# Altium schematic symbol library SparkFun.SCHLIB: 796 symbols (part 4 of 5) (continued)
## RESISTOR
designator R?, comment ResistorBasic schematic elements and footprints for 0603, 1206, and PTH 1/10th watt (small) resistors.
footprint 0805
pins: 1, 2

## RESISTOR0402-RES
designator R?, comment ResistorBasic schematic elements and footprints for 0603, 1206, and PTH 1/10th watt (small) resistors.
footprint 0402-RES
pins: 1, 2

## RESISTOR0603-RES
designator R?, comment ResistorBasic schematic elements and footprints for 0603, 1206, and PTH 1/10th watt (small) resistors.
footprint 0603-RES
pins: 1, 2

## RESISTOR1206
designator R?, comment ResistorBasic schematic elements and footprints for 0603, 1206, and PTH 1/10th watt (small) resistors.
footprint 1206
pins: 1, 2

## RESISTOR2010
designator R?, comment ResistorBasic schematic elements and footprints for 0603, 1206, and PTH 1/10th watt (small) resistors.
footprint R2010
pins: 1, 2

## RESISTOR2512
designator R?, comment ResistorBasic schematic elements and footprints for 0603, 1206, and PTH 1/10th watt (small) resistors.
footprint R2512
pins: 1, 2

## RESISTORPTH1
designator R?, comment ResistorBasic schematic elements and footprints for 0603, 1206, and PTH 1/10th watt (small) resistors.
footprint AXIAL-0.3
pins: P$1 1, P$2 2

## RESISTORPTH-1/6W
designator R?, comment ResistorBasic schematic elements and footprints for 0603, 1206, and PTH 1/10th watt (small) resistors.
footprint 1/6W-RES
pins: 1, 2

## RESONATOR-WIDE
designator ?
footprint RESONATOR-WIDE-SMD
pins: 1, 2, 3

## RESONATOR_NOCAP
designator ?
footprint RESONATOR_NOCAP
pins: P$1 1, P$2 3

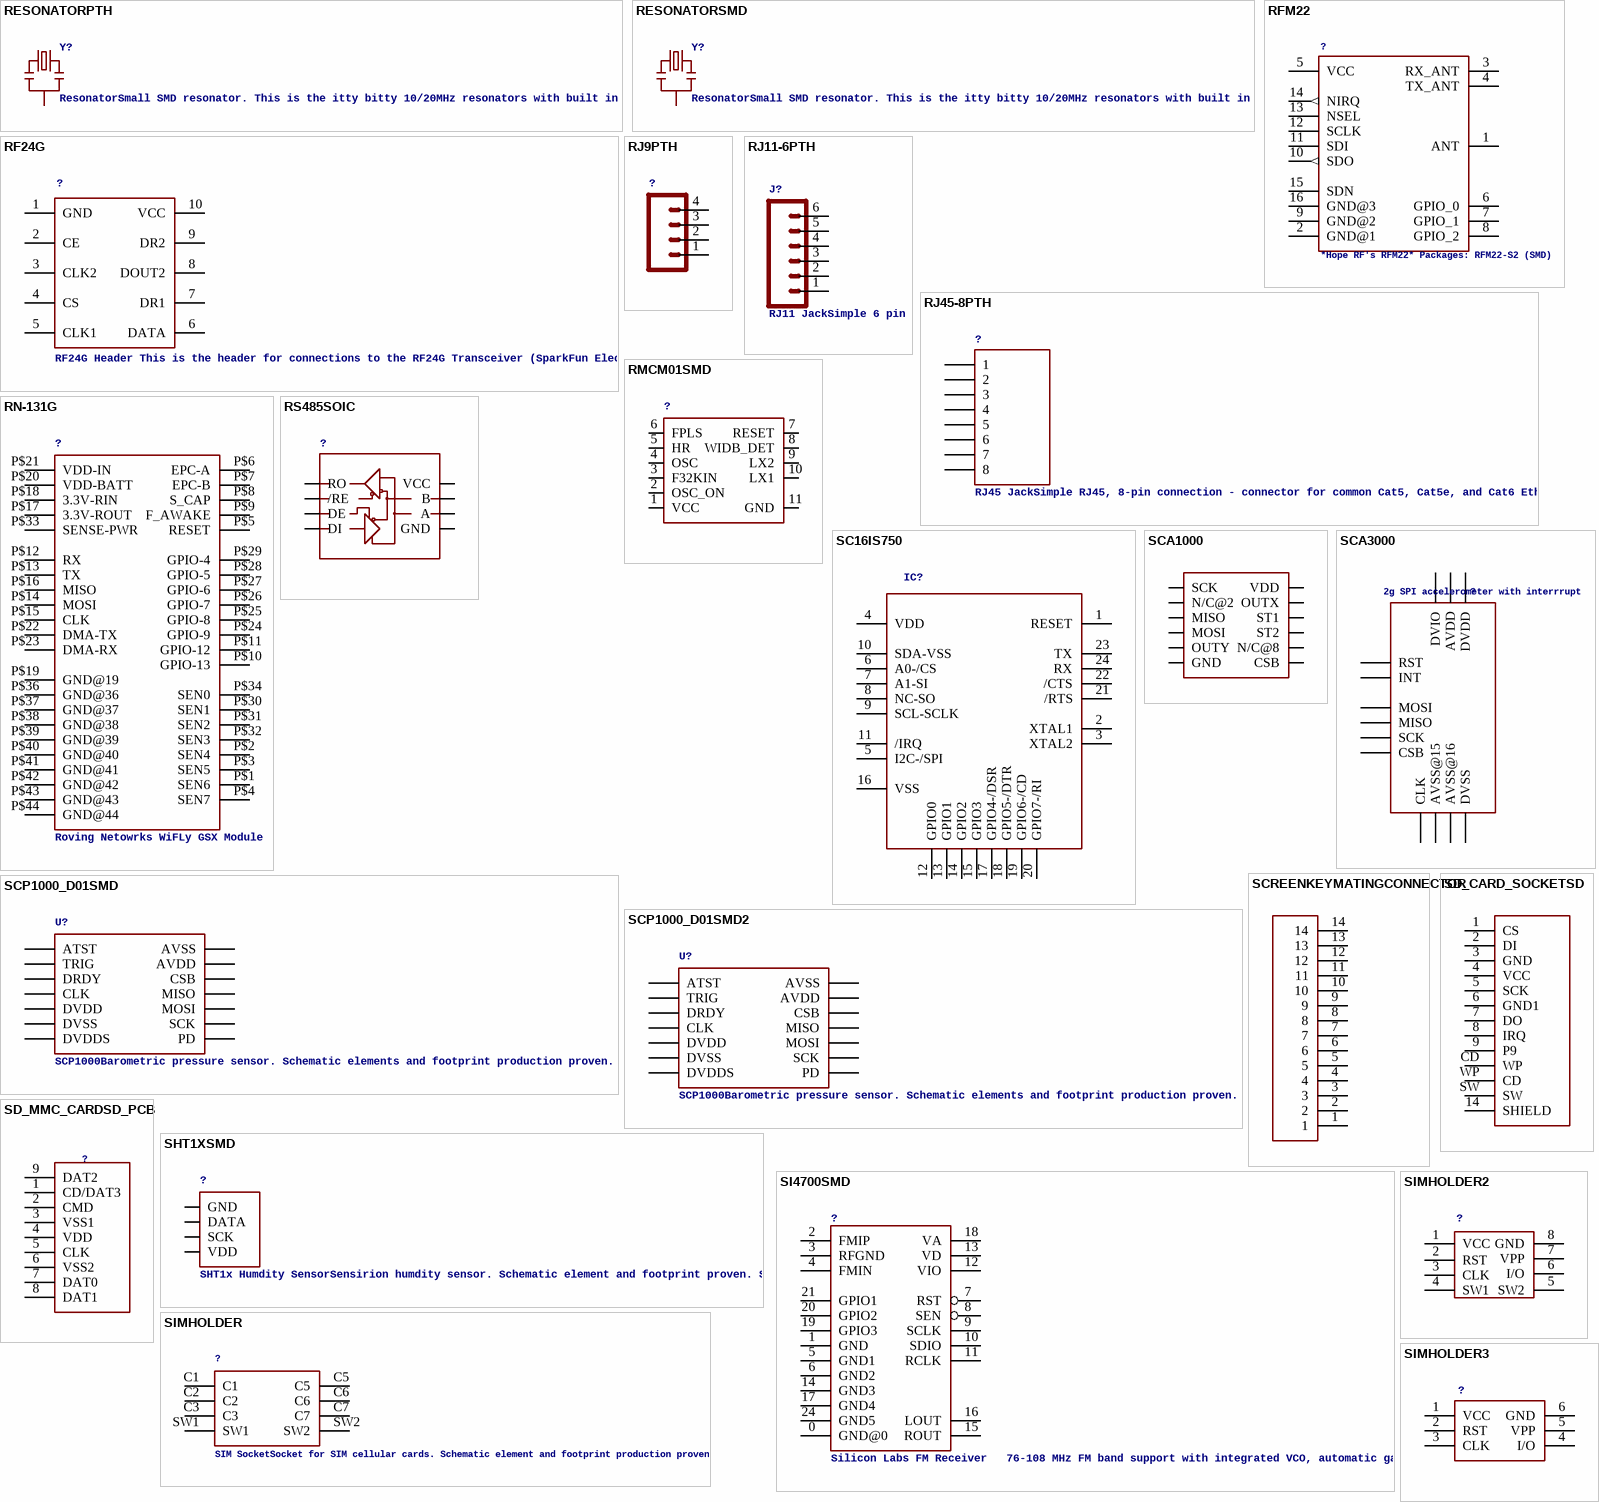
[diagram p29: symbols RESONATORPTH to SIMHOLDER3]

## RESONATORPTH
designator Y?, comment ResonatorSmall SMD resonator. This is the itty bitty 10/20MHz resonators with built in caps. CSTCE10M0G55 and CSTCE20M0V53. Footprint has been reviewed closely but hasn't been tested yet.
footprint RESONATOR-PTH
pins: 1, 2, 3

## RESONATORSMD
designator Y?, comment ResonatorSmall SMD resonator. This is the itty bitty 10/20MHz resonators with built in caps. CSTCE10M0G55 and CSTCE20M0V53. Footprint has been reviewed closely but hasn't been tested yet.
footprint RESONATOR-SMD
pins: 1, 2, 3

## RF24G
designator ?, comment RF24G Header This is the header for connections to the RF24G Transceiver (SparkFun Electronics SKU: WRL-00151), used in the Breakout Board for RF24G Transceiver (SparkFun Electronics SKU: BOB-00196). This footprint has not yet been proven in production.
footprint RF24G-2X5
pins: 1 GND, 2 CE, 3 CLK2, 4 CS, 5 CLK1, 6 DATA, 7 DR1, 8 DOUT2, 9 DR2, 10 VCC

## RFM22
designator ?, comment *Hope RF's RFM22* Packages: RFM22-S2 (SMD)
footprint RFM22-XXX-S2
pins: 1 ANT, 2 GND@1 (power), 3 RX_ANT, 4 TX_ANT, 5 VCC, 6 GPIO_0, 7 GPIO_1, 8 GPIO_2, 9 GND@2 (power), 10 SDO (out), 11 SDI, 12 SCLK, 13 NSEL, 14 NIRQ (out), 15 SDN, 16 GND@3 (power)

## RJ9PTH
designator ?
footprint RJ9
pins: 1, 2, 3, 4

## RJ11-6PTH
designator J?, comment RJ11 JackSimple 6 pin RJ11 jack. Commonly found on CAT3 devices and Microchip programmers. SKU: PRT-00132
footprint RJ11-6
pins: 1, 2, 3, 4, 5, 6

## RJ45-8PTH
designator ?, comment RJ45 JackSimple RJ45, 8-pin connection - connector for common Cat5, Cat5e, and Cat6 Ethernet cables. Footprint not yet proven in production. Connector sku is PRT-00643; Breakout PCB sku is BOB-00716.
footprint RJ45-8
pins: 1, 2, 3, 4, 5, 6, 7, 8

## RMCM01SMD
designator ?
footprint RMCM01
pins: 1 VCC, 2 OSC_ON, 3 F32KIN, 4 OSC, 5 HR, 6 FPLS, 7 RESET, 8 WIDB_DET, 9 LX2, 10 LX1, 11 GND

## RN-131G
designator ?, comment Roving Netowrks WiFLy GSX Module
footprint RN-131G
pins: P$1 SEN6, P$2 SEN4, P$3 SEN5, P$4 SEN7, P$5 RESET, P$6 EPC-A, P$7 EPC-B, P$8 S_CAP, P$9 F_AWAKE, P$10 GPIO-13, P$11 GPIO-12, P$12 RX, P$13 TX, P$14 MOSI, P$15 CLK, P$16 MISO, P$17 3.3V-ROUT, P$18 3.3V-RIN, P$19 GND@19, P$20 VDD-BATT, P$21 VDD-IN, P$22 DMA-TX, P$23 DMA-RX, P$24 GPIO-9, P$25 GPIO-8, P$26 GPIO-7, P$27 GPIO-6, P$28 GPIO-5, P$29 GPIO-4, P$30 SEN1, P$31 SEN2, P$32 SEN3, P$33 SENSE-PWR, P$34 SEN0, P$36 GND@36, P$37 GND@37, P$38 GND@38, P$39 GND@39, P$40 GND@40, P$41 GND@41, P$42 GND@42, P$43 GND@43, P$44 GND@44

## RS485SOIC
designator ?
footprint SO08
pins: 1 RO, 2 /RE, 3 DE, 4 DI, 5 GND, 6 A, 7 B, 8 VCC

## SC16IS750
designator IC?
footprint QFN-24
pins: 1 RESET, 2 XTAL1, 3 XTAL2, 4 VDD, 5 I2C-/SPI, 6 A0-/CS, 7 A1-SI, 8 NC-SO, 9 SCL-SCLK, 10 SDA-VSS, 11 /IRQ, 12 GPIO0, 13 GPIO1, 14 GPIO2, 15 GPIO3, 16 VSS, 17 GPIO4-/DSR, 18 GPIO5-/DTR, 19 GPIO6-/CD, 20 GPIO7-/RI, 21 /RTS, 22 /CTS, 23 TX, 24 RX

## SCA1000
designator ?
footprint SCA1000
pins: 1 SCK, 2 N/C@2, 3 MISO, 4 MOSI, 5 OUTY, 6 GND, 7 CSB, 8 N/C@8, 9 ST2, 10 ST1, 11 OUTX, 12 VDD

## SCA3000
designator ?, comment 2g SPI accelerometer with interrrupt
footprint SCA3000
pins: P$2 RST, P$3 INT, P$4 CLK, P$5 DVSS, P$6 DVDD, P$7 DVIO, P$8 CSB, P$11 SCK, P$12 MISO, P$13 MOSI, P$14 AVDD, P$15 AVSS@15, P$16 AVSS@16

## SCP1000_D01SMD
designator U?, comment SCP1000Barometric pressure sensor. Schematic elements and footprint production proven. Spark Fun Electronics SKU : COM-08128
footprint SCP1000
pins: ATST, AVDD, AVSS, CLK, CSB, DRDY, DVDD, DVDDS, DVSS, MISO, MOSI/SDA MOSI, PD, SCK/SCL SCK, TRIG

## SCP1000_D01SMD2
designator U?, comment SCP1000Barometric pressure sensor. Schematic elements and footprint production proven. Spark Fun Electronics SKU : COM-08128
footprint SCP1000-LG
pins: ATST, AVDD, AVSS, CLK, CSB, DRDY, DVDD, DVDDS, DVSS, MISO, MOSI/SDA MOSI, PD, SCK/SCL SCK, TRIG

## SCREENKEYMATINGCONNECTOR
designator ?
footprint SCREENKEYMATINGCONNECTOR
pins: 1, 2, 3, 4, 5, 6, 7, 8, 9, 10, 11, 12, 13, 14

## SD_CARD_SOCKETSD
designator ?, comment SD/MMC SocketMedia socket for SD and MMC cards. Push-push type. Schematic element and footprint production proven. Spark Fun Electronics SKU : PRT-00136  (value not drawn)
footprint SD-MMC_SOCKET-PP
pins: 1 CS, 2 DI, 3 GND, 4 VCC, 5 SCK, 6 GND1, 7 DO, 8 IRQ, 9 P9, 14 SHIELD, CD WP, SW, WP CD

## SD_MMC_CARDSD_PCB
designator ?
footprint SD-MMC-CARD
pins: 1 CD/DAT3, 2 CMD, 3 VSS1, 4 VDD, 5 CLK, 6 VSS2, 7 DAT0, 8 DAT1, 9 DAT2

## SHT1XSMD
designator ?, comment SHT1x Humdity SensorSensirion humdity sensor. Schematic element and footprint proven. Spark Fun Electronics SKU : COM-08227
footprint SHT1X
pins: 1 GND (power), 2 DATA, 3 SCK, 4 VDD (power)

## SI4700SMD
designator ?, comment Silicon Labs FM Receiver   76-108 MHz FM band support with integrated VCO, automatic gain control, automatic frequency control and seek tuning.
footprint SI4700/01-GM
pins: 0 GND@0, 1 GND, 2 FMIP, 3 RFGND, 4 FMIN, 5 GND1, 6 GND2, 7 RST, 8 SEN, 9 SCLK, 10 SDIO, 11 RCLK, 12 VIO (power), 13 VD (power), 14 GND3, 15 ROUT, 16 LOUT, 17 GND4, 18 VA (power), 19 GPIO3, 20 GPIO2, 21 GPIO1, 24 GND5

## SIMHOLDER
designator ?, comment SIM SocketSocket for SIM cellular cards. Schematic element and footprint production proven. Spark Fun Electronics SKU : PRT-00548
footprint SIMHOLDER
pins: C1, C2, C3, C5, C6, C7, SW1, SW2

## SIMHOLDER2
designator ?
footprint SIMHOLDER2
pins: 1 VCC, 2 RST, 3 CLK, 4 SW1, 5 SW2, 6 I/O, 7 VPP, 8 GND

## SIMHOLDER3
designator ?
footprint SIMHOLDER3
pins: 1 VCC, 2 RST, 3 CLK, 4 I/O, 5 VPP, 6 GND

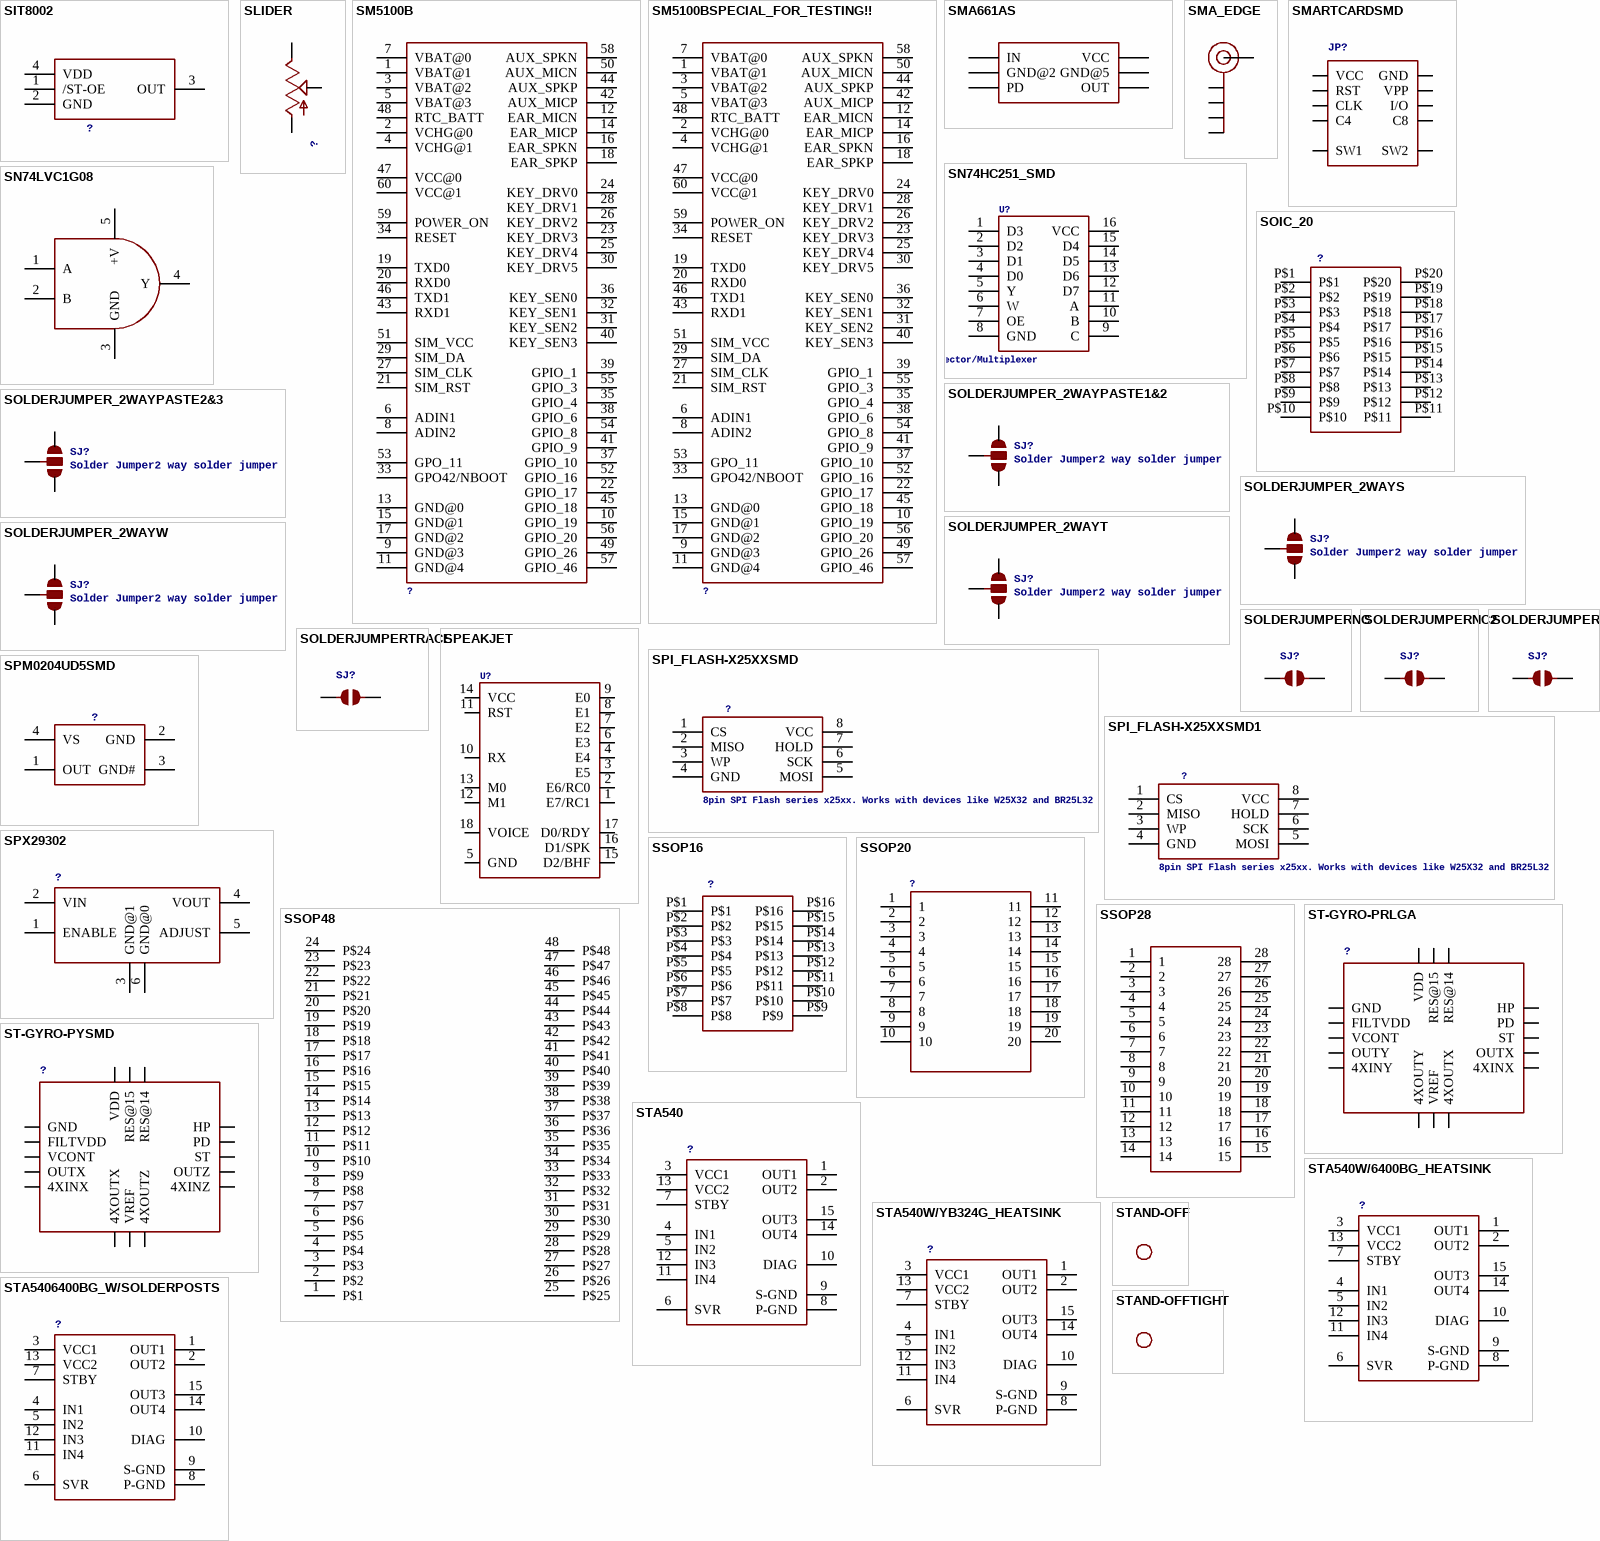
[diagram p30: symbols SIT8002 to STAND-OFFTIGHT]

## SIT8002
designator ?
footprint SIT8002
pins: 1 /ST-OE, 2 GND, 3 OUT, 4 VDD

## SLIDER
designator ?
footprint SLIDER
pins: 1 E, 2A S, 3 A

## SM5100B
designator ?
footprint SM5100B
pins: 1 VBAT@1, 2 VCHG@0, 3 VBAT@2, 4 VCHG@1, 5 VBAT@3, 6 ADIN1, 7 VBAT@0, 8 ADIN2, 9 GND@3, 10 GPIO_19, 11 GND@4, 12 EAR_MICN, 13 GND@0, 14 EAR_MICP, 15 GND@1, 16 EAR_SPKN, 17 GND@2, 18 EAR_SPKP, 19 TXD0, 20 RXD0, 21 SIM_RST, 22 GPIO_17, 23 KEY_DRV3, 24 KEY_DRV0, 25 KEY_DRV4, 26 KEY_DRV2, 27 SIM_CLK, 28 KEY_DRV1, 29 SIM_DA, 30 KEY_DRV5, 31 KEY_SEN2, 32 KEY_SEN1, 33 GPO42/NBOOT, 34 RESET, 35 GPIO_4, 36 KEY_SEN0, 37 GPIO_10, 38 GPIO_6, 39 GPIO_1, 40 KEY_SEN3, 41 GPIO_9, 42 AUX_MICP, 43 RXD1, 44 AUX_SPKP, 45 GPIO_18, 46 TXD1, 47 VCC@0, 48 RTC_BATT, 49 GPIO_26, 50 AUX_MICN, 51 SIM_VCC, 52 GPIO_16, 53 GPO_11, 54 GPIO_8, 55 GPIO_3, 56 GPIO_20, 57 GPIO_46, 58 AUX_SPKN, 59 POWER_ON, 60 VCC@1

## SM5100BSPECIAL_FOR_TESTING!!
designator ?
footprint SM5100B-SPECIAL_FOR_TESTING
pins: 1 VBAT@1, 2 VCHG@0, 3 VBAT@2, 4 VCHG@1, 5 VBAT@3, 6 ADIN1, 7 VBAT@0, 8 ADIN2, 9 GND@3, 10 GPIO_19, 11 GND@4, 12 EAR_MICN, 13 GND@0, 14 EAR_MICP, 15 GND@1, 16 EAR_SPKN, 17 GND@2, 18 EAR_SPKP, 19 TXD0, 20 RXD0, 21 SIM_RST, 22 GPIO_17, 23 KEY_DRV3, 24 KEY_DRV0, 25 KEY_DRV4, 26 KEY_DRV2, 27 SIM_CLK, 28 KEY_DRV1, 29 SIM_DA, 30 KEY_DRV5, 31 KEY_SEN2, 32 KEY_SEN1, 33 GPO42/NBOOT, 34 RESET, 35 GPIO_4, 36 KEY_SEN0, 37 GPIO_10, 38 GPIO_6, 39 GPIO_1, 40 KEY_SEN3, 41 GPIO_9, 42 AUX_MICP, 43 RXD1, 44 AUX_SPKP, 45 GPIO_18, 46 TXD1, 47 VCC@0, 48 RTC_BATT, 49 GPIO_26, 50 AUX_MICN, 51 SIM_VCC, 52 GPIO_16, 53 GPO_11, 54 GPIO_8, 55 GPIO_3, 56 GPIO_20, 57 GPIO_46, 58 AUX_SPKN, 59 POWER_ON, 60 VCC@1

## SMA661AS
designator ?, comment GPS LNA, 18dB gain, low external parts count  (value not drawn)
footprint SOT666
pins: 1 IN, 2 GND@2, 3 PD, 4 OUT, 5 GND@5, 6 VCC

## SMA_EDGE
designator J$?, comment SMA Antenna ConnectorEnd launch SMA connector. The paste layer has been removed so that the connector can be hand soldered onto the board after reflow.  (value not drawn)
footprint SMA-EDGE
pins: GND@0, GND@1, GND@2, GND@3, SIG SIGNAL

## SMARTCARDSMD
designator JP?
footprint SMARTCARD
pins: C1 VCC, C2 RST, C3 CLK, C4, C5 GND, C6 VPP, C7 I/O, C8, P1 SW1, P2 SW2

## SN74HC251_SMD
designator U?, comment SN54HC251 Data Selector/Multiplexer
footprint SO016
pins: 1 D3, 2 D2, 3 D1, 4 D0, 5 Y, 6 W, 7 OE, 8 GND, 9 C, 10 B, 11 A, 12 D7, 13 D6, 14 D5, 15 D4, 16 VCC

## SN74LVC1G08
designator ?
footprint SOT23-5
pins: 1 A, 2 B, 3 GND, 4 Y, 5 +V

## SOIC_20
designator ?
footprint SO20W
pins: P$1, P$2, P$3, P$4, P$5, P$6, P$7, P$8, P$9, P$10, P$11, P$12, P$13, P$14, P$15, P$16, P$17, P$18, P$19, P$20

## SOLDERJUMPER_2WAYPASTE1&2
designator SJ?, comment Solder Jumper2 way solder jumper
footprint SJ_3_PASTE1&2
pins: 1, 2, 3

## SOLDERJUMPER_2WAYPASTE2&3
designator SJ?, comment Solder Jumper2 way solder jumper
footprint SJ_3_PASTE2&3
pins: 1, 2, 3

## SOLDERJUMPER_2WAYS
designator SJ?, comment Solder Jumper2 way solder jumper
footprint SJ_3
pins: 1, 2, 3

## SOLDERJUMPER_2WAYT
designator SJ?, comment Solder Jumper2 way solder jumper
footprint SJ_2
pins: 1, 2, 3

## SOLDERJUMPER_2WAYW
designator SJ?, comment Solder Jumper2 way solder jumper
footprint SJ_2W
pins: 1, 2, 3

## SOLDERJUMPERNC
designator SJ?, comment Solder JumperStandard SMD solder jumper. Used to automate production. Two varients : Normally Open and Normally Closed are the same, but have different paste layers. NC will have a large amount of paste and should jumper during reflow.  (value not drawn)
footprint SJ_2S
pins: 1, 2

## SOLDERJUMPERNC2
designator SJ?, comment Solder JumperStandard SMD solder jumper. Used to automate production. Two varients : Normally Open and Normally Closed are the same, but have different paste layers. NC will have a large amount of paste and should jumper during reflow.  (value not drawn)
footprint SJ_2S-NOTRACE
pins: 1, 2

## SOLDERJUMPERNO
designator SJ?, comment Solder JumperStandard SMD solder jumper. Used to automate production. Two varients : Normally Open and Normally Closed are the same, but have different paste layers. NC will have a large amount of paste and should jumper during reflow.  (value not drawn)
footprint SJ_2S-NO
pins: 1, 2

## SOLDERJUMPERTRACE
designator SJ?, comment Solder JumperStandard SMD solder jumper. Used to automate production. Two varients : Normally Open and Normally Closed are the same, but have different paste layers. NC will have a large amount of paste and should jumper during reflow.  (value not drawn)
footprint SJ_2S-TRACE
pins: 1, 2

## SPEAKJET
designator U?
footprint DIL18
pins: 1 E7/RC1, 2 E6/RC0, 3 E5, 4 E4, 5 GND, 6 E3, 7 E2, 8 E1, 9 E0, 10 RX, 11 RST, 12 M1, 13 M0, 14 VCC, 15 D2/BHF, 16 D1/SPK, 17 D0/RDY, 18 VOICE

## SPI_FLASH-X25XXSMD
designator ?, comment 8pin SPI Flash series x25xx. Works with devices like W25X32 and BR25L32
footprint SO08
pins: 1 CS, 2 MISO, 3 WP, 4 GND, 5 MOSI, 6 SCK, 7 HOLD, 8 VCC

## SPI_FLASH-X25XXSMD1
designator ?, comment 8pin SPI Flash series x25xx. Works with devices like W25X32 and BR25L32
footprint SO08-EIAJ
pins: 1 CS, 2 MISO, 3 WP, 4 GND, 5 MOSI, 6 SCK, 7 HOLD, 8 VCC

## SPM0204UD5SMD
designator ?
footprint SPM0204UD5
pins: 1 OUT, 2 GND, 3 GND#, 4 VS

## SPX29302
designator ?
footprint Q5-DD_SPX29300
pins: 1 ENABLE, 2 VIN, 3 GND@1, 4 VOUT, 5 ADJUST, 6 GND@0

## SSOP16
designator ?
footprint SSOP16
pins: P$1, P$2, P$3, P$4, P$5, P$6, P$7, P$8, P$9, P$10, P$11, P$12, P$13, P$14, P$15, P$16

## SSOP20
designator ?
footprint SSOP20-LONG
pins: 1, 2, 3, 4, 5, 6, 7, 8, 9, 10, 11, 12, 13, 14, 15, 16, 17, 18, 19, 20

## SSOP28
designator ?
footprint SSOP28DB
pins: 1, 2, 3, 4, 5, 6, 7, 8, 9, 10, 11, 12, 13, 14, 15, 16, 17, 18, 19, 20, 21, 22, 23, 24, 25, 26, 27, 28

## SSOP48
designator ?
footprint SSOP48
pins: 1 P$1, 2 P$2, 3 P$3, 4 P$4, 5 P$5, 6 P$6, 7 P$7, 8 P$8, 9 P$9, 10 P$10, 11 P$11, 12 P$12, 13 P$13, 14 P$14, 15 P$15, 16 P$16, 17 P$17, 18 P$18, 19 P$19, 20 P$20, 21 P$21, 22 P$22, 23 P$23, 24 P$24, 25 P$25, 26 P$26, 27 P$27, 28 P$28, 29 P$29, 30 P$30, 31 P$31, 32 P$32, 33 P$33, 34 P$34, 35 P$35, 36 P$36, 37 P$37, 38 P$38, 39 P$39, 40 P$40, 41 P$41, 42 P$42, 43 P$43, 44 P$44, 45 P$45, 46 P$46, 47 P$47, 48 P$48

## ST-GYRO-PRLGA
designator ?
footprint ST-GYRO
pins: 1 GND, 2 FILTVDD, 3 VCONT, 4 OUTY, 5 4XINY, 6 4XOUTY, 7 VREF, 8 4XOUTX, 9 4XINX, 10 OUTX, 11 ST, 12 PD, 13 HP, 14 RES@14, 15 RES@15, 16 VDD

## ST-GYRO-PYSMD
designator ?
footprint ST-GYRO
pins: 1 GND, 2 FILTVDD, 3 VCONT, 4 OUTX, 5 4XINX, 6 4XOUTX, 7 VREF, 8 4XOUTZ, 9 4XINZ, 10 OUTZ, 11 ST, 12 PD, 13 HP, 14 RES@14, 15 RES@15, 16 VDD

## STA540
designator ?
footprint MULTIWATT15
pins: 1 OUT1, 2 OUT2, 3 VCC1, 4 IN1, 5 IN2, 6 SVR, 7 STBY, 8 P-GND, 9 S-GND, 10 DIAG, 11 IN4, 12 IN3, 13 VCC2, 14 OUT4, 15 OUT3

## STA540W/6400BG_HEATSINK
designator ?
footprint MULTIWATT15_6400BGHEATSINK
pins: 1 OUT1, 2 OUT2, 3 VCC1, 4 IN1, 5 IN2, 6 SVR, 7 STBY, 8 P-GND, 9 S-GND, 10 DIAG, 11 IN4, 12 IN3, 13 VCC2, 14 OUT4, 15 OUT3

## STA540W/YB324G_HEATSINK
designator ?
footprint MULTIWATT15_YB324GHEATSINK
pins: 1 OUT1, 2 OUT2, 3 VCC1, 4 IN1, 5 IN2, 6 SVR, 7 STBY, 8 P-GND, 9 S-GND, 10 DIAG, 11 IN4, 12 IN3, 13 VCC2, 14 OUT4, 15 OUT3

## STA5406400BG_W/SOLDERPOSTS
designator ?
footprint MULTIWATT15_6400BGHEATSINK_2
pins: 1 OUT1, 2 OUT2, 3 VCC1, 4 IN1, 5 IN2, 6 SVR, 7 STBY, 8 P-GND, 9 S-GND, 10 DIAG, 11 IN4, 12 IN3, 13 VCC2, 14 OUT4, 15 OUT3

## STAND-OFF
designator JP?, comment Stand Off   This is the mechanical footprint for a #4 phillips button head screw. Use the keepout ring to avoid running the screw head into surrounding components. SKU : PRT-00447  (value not drawn)
footprint STAND-OFF

## STAND-OFFTIGHT
designator JP?, comment Stand Off   This is the mechanical footprint for a #4 phillips button head screw. Use the keepout ring to avoid running the screw head into surrounding components. SKU : PRT-00447  (value not drawn)
footprint STAND-OFF-TIGHT

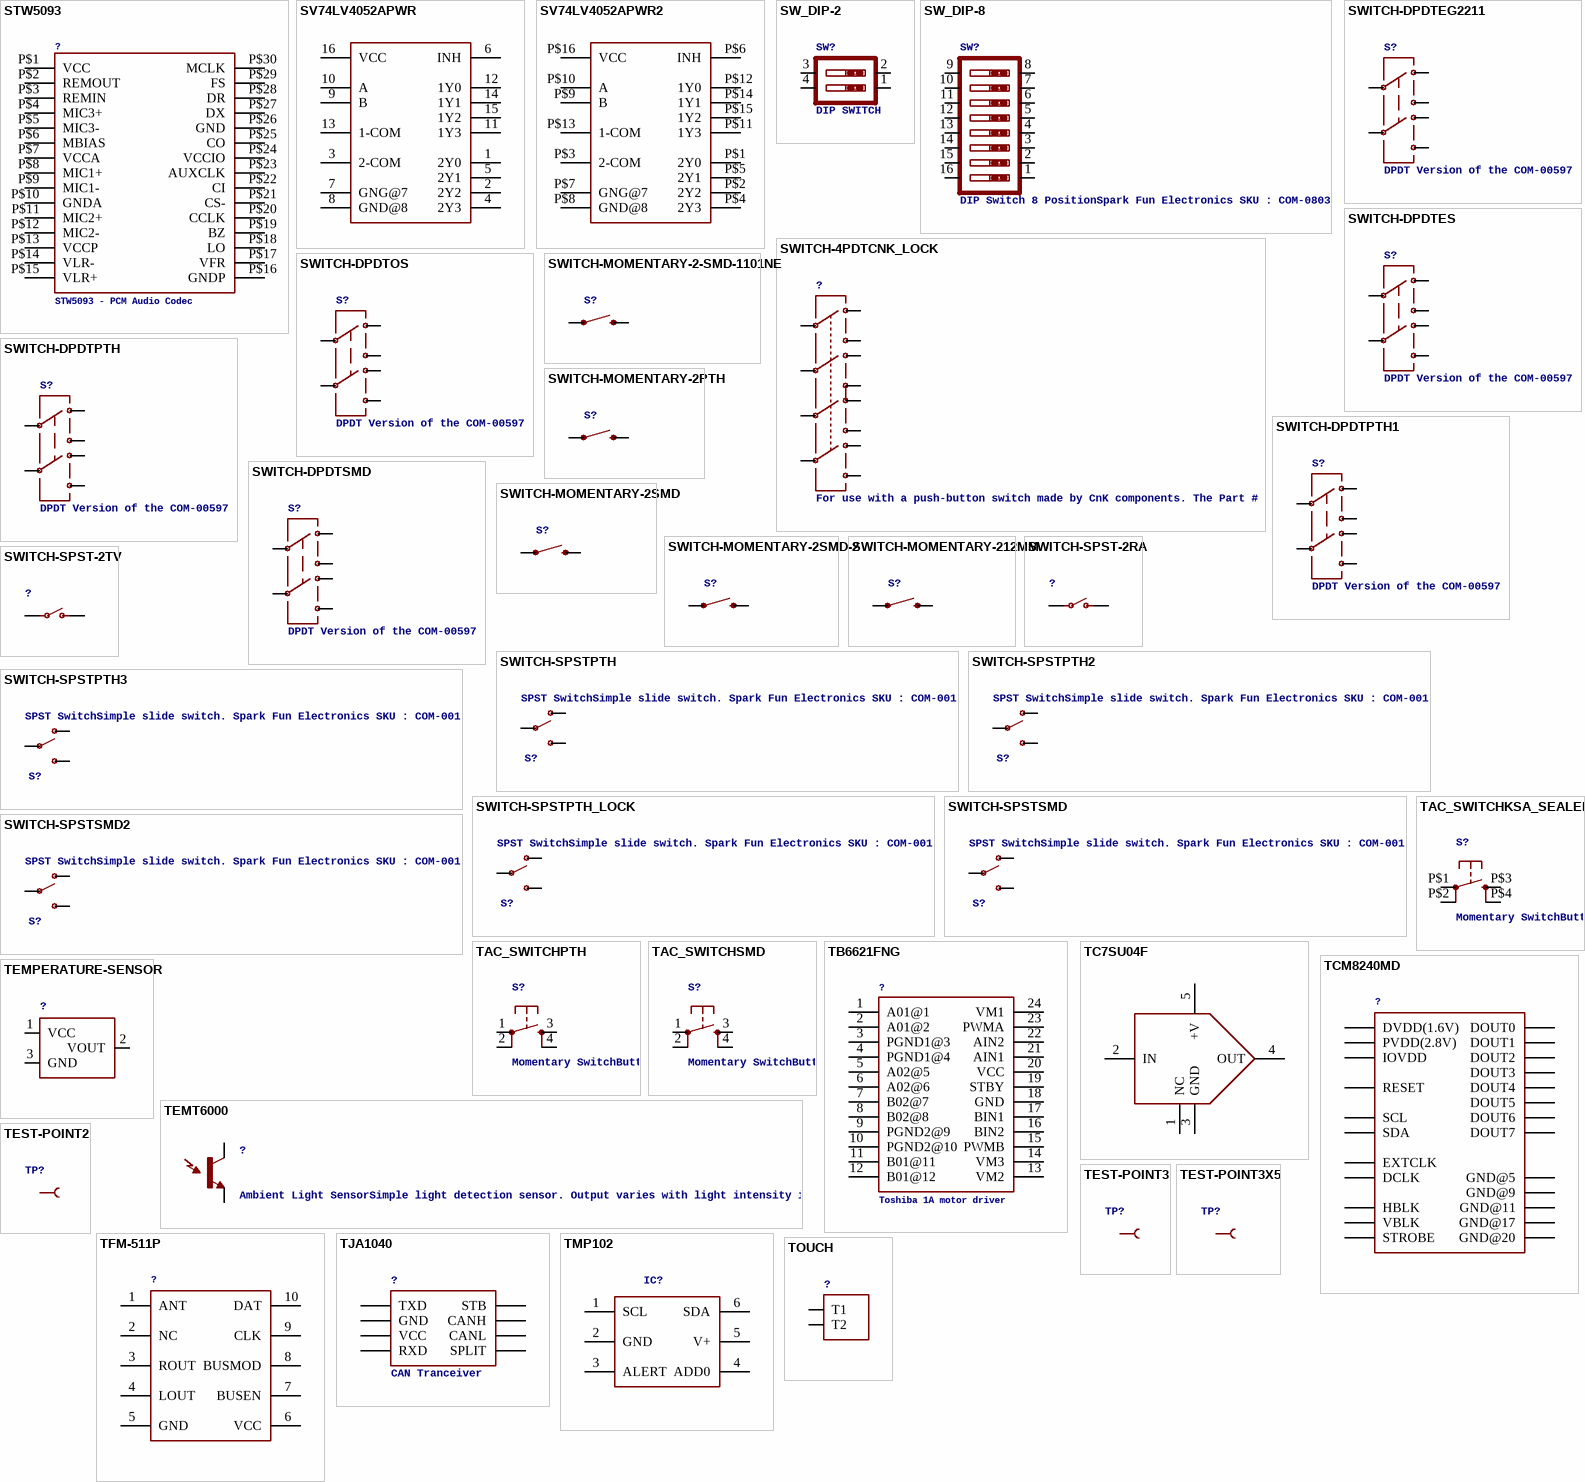
[diagram p31: symbols STW5093 to TOUCH]

## STW5093
designator ?, comment STW5093 - PCM Audio Codec
footprint TSSOP30
pins: P$1 VCC, P$2 REMOUT, P$3 REMIN, P$4 MIC3+, P$5 MIC3-, P$6 MBIAS, P$7 VCCA, P$8 MIC1+, P$9 MIC1-, P$10 GNDA, P$11 MIC2+, P$12 MIC2-, P$13 VCCP, P$14 VLR-, P$15 VLR+, P$16 GNDP, P$17 VFR, P$18 LO, P$19 BZ, P$20 CCLK, P$21 CS-, P$22 CI, P$23 AUXCLK, P$24 VCCIO, P$25 CO, P$26 GND, P$27 DX, P$28 DR, P$29 FS, P$30 MCLK

## SV74LV4052APWR
designator ?
footprint TSSOP16
pins: 1 2Y0, 2 2Y2, 3 2-COM, 4 2Y3, 5 2Y1, 6 INH, 7 GNG@7, 8 GND@8, 9 B, 10 A, 11 1Y3, 12 1Y0, 13 1-COM, 14 1Y1, 15 1Y2, 16 VCC

## SV74LV4052APWR2
designator ?
footprint TVSOP-16
pins: P$1 2Y0, P$2 2Y2, P$3 2-COM, P$4 2Y3, P$5 2Y1, P$6 INH, P$7 GNG@7, P$8 GND@8, P$9 B, P$10 A, P$11 1Y3, P$12 1Y0, P$13 1-COM, P$14 1Y1, P$15 1Y2, P$16 VCC

## SW_DIP-2
designator SW?, comment DIP SWITCH
footprint DIPSWITCH-02
pins: 1, 2, 3, 4

## SW_DIP-8
designator SW?, comment DIP Switch 8 PositionSpark Fun Electronics SKU : COM-08034
footprint DIPSWITCH-08
pins: 1, 2, 3, 4, 5, 6, 7, 8, 9, 10, 11, 12, 13, 14, 15, 16

## SWITCH-4PDTCNK_LOCK
designator ?, comment For use with a push-button switch made by CnK components. The Part # is
footprint SWITCH-4PDT-CNK
pins: PP$1 1, PP$2 2, PP$3 3, PP$4 4, PP$5 5, PP$6 6, PP$7 7, PP$8 8, PP$9 9, PP$10 10, PP$11 11, PP$12 12

## SWITCH-DPDTEG2211
designator S?, comment DPDT Version of the COM-00597
footprint EG2211
pins: P1 2, P1-TA 1, P1-TB 3, P2 5, P2-TA 4, P2-TB 6

## SWITCH-DPDTES
designator S?, comment DPDT Version of the COM-00597
footprint ES
pins: 1, 2, 3, 4, 5, 6

## SWITCH-DPDTOS
designator S?, comment DPDT Version of the COM-00597
footprint OS
pins: 1, 2, 3, 4, 5, 6

## SWITCH-DPDTPTH
designator S?, comment DPDT Version of the COM-00597
footprint MSS22
pins: 1, 2, 3, 4, 5, 6

## SWITCH-DPDTPTH1
designator S?, comment DPDT Version of the COM-00597
footprint MS
pins: 1, 2, 3, 4, 5, 6

## SWITCH-DPDTSMD
designator S?, comment DPDT Version of the COM-00597
footprint AYZ0202
pins: 1, 2, 3, 4, 5, 6

## SWITCH-MOMENTARY-2-SMD-1101NE
designator S?
footprint TACTILE-SWITCH-1101NE
pins: P$1 1, P$2 2

## SWITCH-MOMENTARY-2PTH
designator S?
footprint TACTILE-PTH
pins: 1, 3 2